# Altium footprint library AI.PcbLib: 137 footprints (part 9 of 9)
Each footprint in its own frame and in the unit in brackets; x right, y up, seen from the top. Pads: shape width x height; smd on the part's side, far side on the other; paste and mask are expansions set on the pad; w line width, h text height; cw(c..) or ccw(c..) is an arc to the next point about the centre after c.
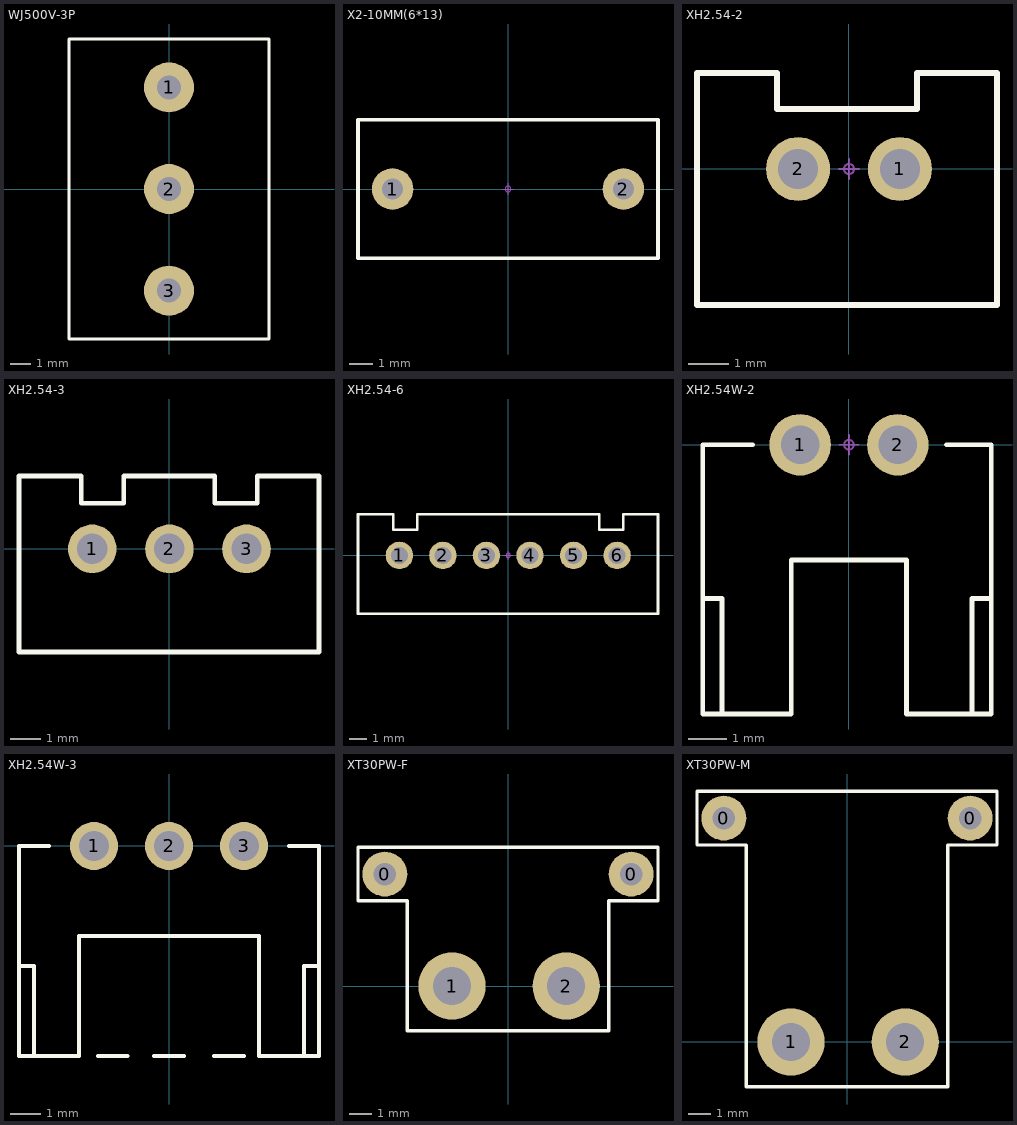
[diagram p8: the footprints below, top view; thin cyan lines are the x and y axes]

## WJ500V-3P [mm] "ONSHORE"
height 13
pads (3):
  round 2.5 hole 1.2: 1(0,5.08) 2(0,0) 3(0,-5.08)
Top Overlay:
  lines w0.152: -5,-7.5 5,-7.5 5,7.5 -5,7.5 -5,-7.5
Mechanical 15:
  circle w0.05: c0,0 r0.125
  lines w0.05: -0.25,0 0.25,0 ; 0,-0.25 0,0.25
3D body "jxdz2-3.stp": height 14, standoff -4, extent -5,-7.5 5,7.5

## X2-10MM(6*13) [mm]
pads (2):
  round 1.8 hole 0.9: 1(-5,0) 2(5,0)
Top Overlay:
  lines w0.152: -6.5,-3 6.5,-3 6.5,3 -6.5,3 -6.5,-3
Mechanical 15:
  circle w0.05: c0,0 r0.125
  lines w0.05: -0.25,0 0.25,0 ; 0,-0.25 0,0.25
3D body "CAPR1000-600X1300X1200.stp": height 12, standoff -3.8, extent -6.5,-3 6.5,3

## XH2.54-2 [mm]
pads (2):
  round 1.6 hole 1: 1(1.271,0) 2(-1.271,0)
Top Overlay:
  lines w0.152: -3.8,-3.4 -3.8,2.4 -1.8,2.4 -1.8,1.5 1.7,1.5 1.7,2.4 3.7,2.4 3.7,-3.4 -3.8,-3.4
Mechanical 15:
  circle w0.05: c0,0 r0.125
  lines w0.05: -0.25,0 0.25,0 ; 0,-0.25 0,0.25
3D body "sip2_n.stp": height 7, standoff -3, extent -3.75,-3.5 3.75,2.5

## XH2.54-3 [mm]
pads (3):
  round 1.6 hole 1: 1(-2.54,0) 2(0,0) 3(2.54,0)
Top Overlay:
  lines w0.152: -4.953,-3.4 4.928,-3.4 4.928,2.4 2.9,2.4 2.9,1.5 1.5,1.5 1.5,2.4 -1.5,2.4 -1.5,1.5 -2.9,1.5 -2.9,2.4 -4.953,2.4 -4.953,-3.4
Mechanical 15:
  circle w0.05: c0,0 r0.125
  lines w0.05: -0.25,0 0.25,0 ; 0,-0.25 0,0.25
3D body "3pin-2.5.step": height 7, standoff -3.4, extent -4.95,-3.408 4.95,2.342

## XH2.54-6 [mm]
pads (6):
  round 1.6 hole 1: 1(-6.35,0) 2(-3.81,0) 3(-1.27,0) 4(1.27,0) 5(3.81,0) 6(6.35,0)
Top Overlay:
  lines w0.152: -8.763,-3.4 -8.763,2.4 -6.71,2.4 -6.71,1.5 -5.31,1.5 -5.31,2.4 5.31,2.4 5.31,1.5 6.71,1.5 6.71,2.4 8.738,2.4 8.738,-3.4 -8.763,-3.4
Mechanical 15:
  circle w0.05: c0,0 r0.125
  lines w0.05: -0.25,0 0.25,0 ; 0,-0.25 0,0.25
3D body "6pin-2.5.step": height 7, standoff -3.4, extent -8.7,-3.383 8.7,2.367

## XH2.54W-2 [mm]
pads (2):
  round 1.6 hole 1: 1(-1.27,0) 2(1.27,0)
Top Overlay:
  lines w0.127: -3.8,-4 -3.3,-4 -3.3,-7 ; -2.5,0 -3.8,0 -3.8,-7 -1.5,-7 -1.5,-3 1.5,-3 1.5,-7 3.7,-7 3.7,0 2.54,0 ; 3.2,-7 3.2,-4 3.7,-4
Mechanical 15:
  circle w0.05: c0,0 r0.125
  lines w0.05: -0.25,0 0.25,0 ; 0,-0.25 0,0.25
3D body "609-2p-vr130.stp": height 5.75, standoff -3.35, extent -3.75,-7.3 3.75,0.34

## XH2.54W-3 [mm]
pads (3):
  round 1.6 hole 1: 1(-2.5,0) 2(0,0) 3(2.5,0)
Top Overlay:
  lines w0.127: -5,-4 -4.5,-4 -4.5,-7 ; -4,0 -5,0 -5,-7 -3,-7 -3,-3 3,-3 3,-7 5,-7 ; -2.375,-7 -1.375,-7 ; -0.5,-7 0.5,-7 ; 1.5,-7 2.5,-7 ; 4,-7 5,-7 ; 4,0 5,0 5,-7 ; 4.5,-7 4.5,-4 5,-4
Mechanical 15:
  circle w0.05: c0,0 r0.125
  lines w0.05: -0.25,0 0.25,0 ; 0,-0.25 0,0.25
3D body "609-3p-vr130.stp": height 5.75, standoff -3.35, extent -5,-7.3 5,0.34

## XT30PW-F [mm]
pads (4):
  round 2 hole 1: 0(-5.5,5) 0(5.5,5)
  round 3 hole 1.7: 1(-2.5,0) 2(2.6,0)
Top Overlay:
  lines w0.152: -6.7,3.8 -4.5,3.8 -4.5,-2 4.5,-2 4.5,3.8 6.7,3.8 6.7,6.2 -6.7,6.2 -6.7,3.8

## XT30PW-M [mm]
pads (4):
  round 2 hole 1: 0(-5.5,10) 0(5.5,10)
  round 3 hole 1.7: 1(-2.5,0) 2(2.6,0)
Top Overlay:
  lines w0.152: -6.7,8.8 -4.5,8.8 -4.5,-2 4.5,-2 4.5,8.8 6.7,8.8 6.7,11.2 -6.7,11.2 -6.7,8.8